# Altium footprint library Components.PcbLib: 260 footprints (part 14 of 17)
Each footprint in its own frame and in the unit in brackets; x right, y up, seen from the top. Pads: shape width x height; smd on the part's side, far side on the other; paste and mask are expansions set on the pad; w line width, h text height; cw(c..) or ccw(c..) is an arc to the next point about the centre after c.
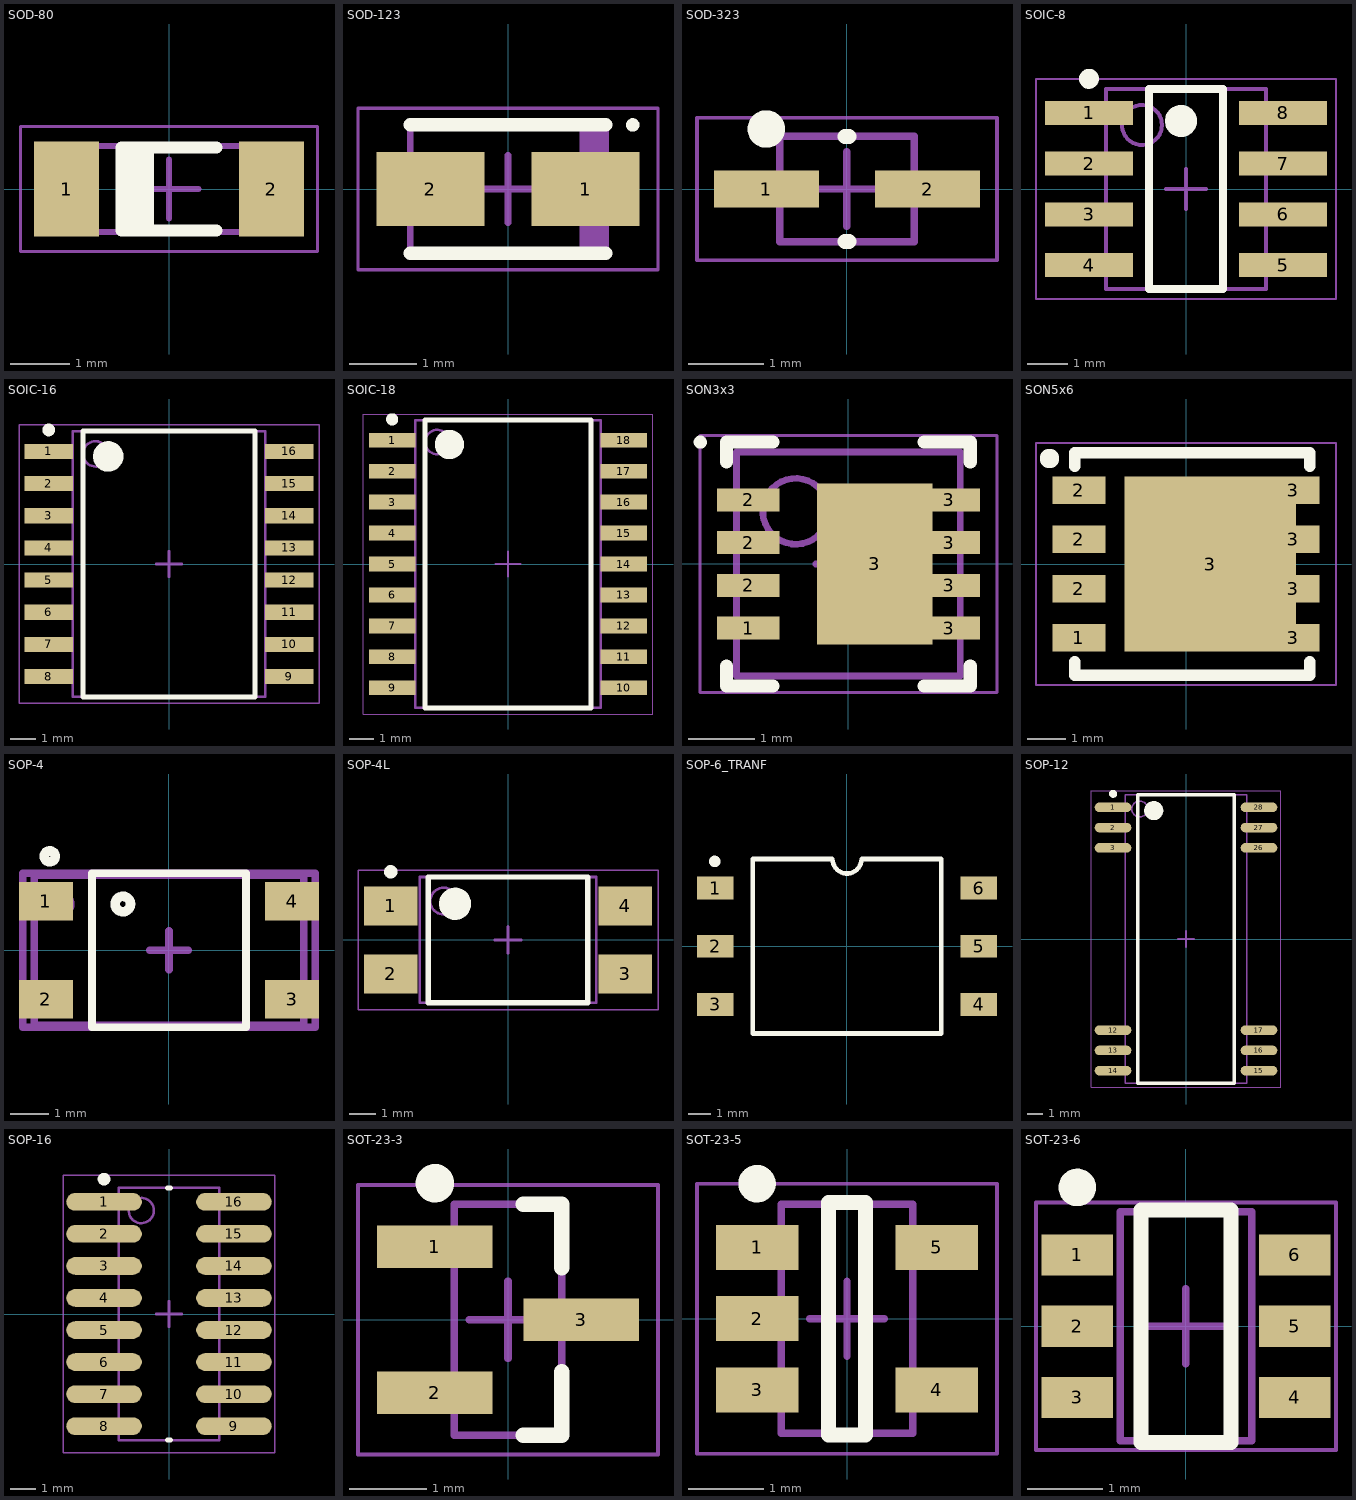
[diagram p13: the footprints below, top view; thin cyan lines are the x and y axes]

## SOD-80 [mm]
height 1.45
pads (2):
  rect 1.1x1.6 smd: 1(-1.725,0) 2(1.725,0)
Top Overlay:
  rectangle: -0.8,-0.7 -0.25,0.7
  lines w0.2: 0.8,-0.7 -0.8,-0.7 -0.8,0.7 0.8,0.7
Mechanical 13:
  lines w0.1: -1.85,-0.725 -1.85,0.725 1.85,0.725 1.85,-0.725 -1.85,-0.725
Mechanical 15:
  lines w0.05: -2.5,-1.05 -2.5,1.05 2.5,1.05 2.5,-1.05 -2.5,-1.05
  lines w0.1: -0.5,0 0.5,0 ; 0,-0.5 0,0.5
3D body: height 1.45, standoff 0, extent -1.85,-0.725 -1.5,0.725
3D body: height 1.44, standoff 0.04, extent -0.9,-0.696 -0.3,0.696
3D body: height 1.44, standoff 0.05, extent -1.5,-0.695 1.5,0.694
3D body: height 1.45, standoff 0, extent 1.5,-0.725 1.85,0.725

## SOD-123 [mm]
height 1.43
pads (2):
  rect 1.6x1.1 smd: 1(1.15,0) 2(-1.15,0)
Top Overlay:
  circle w0.1: c1.85,0.95 r0.05
  lines w0.2: -1.45,-0.95 1.45,-0.95 ; -1.45,0.95 1.45,0.95
Mechanical 13:
  rectangle: 1.06,-0.95 1.45,0.95
  lines w0.1: -1.45,-0.95 1.45,-0.95 1.45,0.95 -1.45,0.95 -1.45,-0.95
Mechanical 15:
  lines w0.05: -2.225,-1.2 2.225,-1.2 2.225,1.2 -2.225,1.2 -2.225,-1.2
  lines w0.1: -0.5,0 0.5,0 ; 0,-0.5 0,0.5
3D body "SMA_SUB.STEP": height 1.35, standoff 0, extent -1.85,-0.9 1.85,0.9

## SOD-323 [mm]
height 1.1
pads (2):
  rect 1.4x0.5 smd: 1(-1.075,0) 2(1.075,0)
Top Overlay:
  circle w0.25: c-1.075,0.8 r0.125
  lines w0.2: -0.025,-0.7 0.025,-0.7 ; -0.025,0.7 0.025,0.7
Mechanical 13:
  lines w0.1: -0.9,-0.7 0.9,-0.7 0.9,0.7 -0.9,0.7 -0.9,-0.7
Mechanical 15:
  lines w0.05: -2,-0.95 2,-0.95 2,0.95 -2,0.95 -2,-0.95
  lines w0.1: -0.5,0 0.5,0 ; 0,-0.5 0,0.5
3D body "SOD-323.step": height 1.1, standoff 0, extent -1.3,-0.675 1.3,0.675

## SOIC-8 [mm]
height 1.75
pads (8):
  rect 2.2x0.6 smd: 1(-2.425,1.905) 2(-2.425,0.635) 3(-2.425,-0.635) 4(-2.425,-1.905) 5(2.425,-1.905) 6(2.425,-0.635) 7(2.425,0.635) 8(2.425,1.905)
Top Overlay:
  circle w0.4: c-0.125,1.7 r0.2
  circle w0.25: c-2.425,2.755 r0.125
  lines w0.2: -0.925,-2.5 0.925,-2.5 0.925,2.5 -0.925,2.5 -0.925,-2.5
Mechanical 13:
  circle w0.1: c-1.1,1.6 r0.5
  lines w0.1: -2,-2.5 2,-2.5 2,2.5 -2,2.5 -2,-2.5
Mechanical 15:
  lines w0.05: -3.75,-2.75 3.75,-2.75 3.75,2.75 -3.75,2.75 -3.75,-2.75
  lines w0.1: -0.5,0 0.5,0 ; 0,-0.5 0,0.5
3D body "SOIC-8.step": height 1.75, standoff 0, extent -3,-2.45 3,2.45

## SOIC-16 [mm] "SOIC, 16-Leads, Body 10,30x7,50mm, Pitch 1,27mm, IPC Medium Density"
height 2.65
pads (16):
  rect 1.9x0.6 smd: 1(-4.75,4.445) 2(-4.75,3.175) 3(-4.75,1.905) 4(-4.75,0.635) 5(-4.75,-0.635) 6(-4.75,-1.905) 7(-4.75,-3.175) 8(-4.75,-4.445) 9(4.75,-4.445) 10(4.75,-3.175) 11(4.75,-1.905) 12(4.75,-0.635) 13(4.75,0.635) 14(4.75,1.905) 15(4.75,3.175) 16(4.75,4.445)
Top Overlay:
  circle w0.25: c-4.75,5.295 r0.125
  circle w0.6: c-2.4,4.25 r0.3
  lines w0.2: -3.4,-5.25 -3.4,5.25 3.4,5.25 3.4,-5.25 -3.4,-5.25
Mechanical 13:
  circle w0.1: c-2.9,4.35 r0.5
  lines w0.1: -3.8,-5.25 -3.8,5.25 3.8,5.25 3.8,-5.25 -3.8,-5.25
Mechanical 15:
  lines w0.05: -5.925,-5.5 -5.925,5.5 5.925,5.5 5.925,-5.5 -5.925,-5.5
  lines w0.1: -0.5,0 0.5,0 ; 0,-0.5 0,0.5
3D body "SOIC-16W.step": height 2.62, standoff -0.03, extent -5.315,-5.25 5.315,5.25

## SOIC-18 [mm]
height 2.65
pads (18):
  rect 1.9x0.6 smd: 1(-4.75,5.08) 2(-4.75,3.81) 3(-4.75,2.54) 4(-4.75,1.27) 5(-4.75,0) 6(-4.75,-1.27) 7(-4.75,-2.54) 8(-4.75,-3.81) 9(-4.75,-5.08) 10(4.75,-5.08) 11(4.75,-3.81) 12(4.75,-2.54) 13(4.75,-1.27) 14(4.75,0) 15(4.75,1.27) 16(4.75,2.54) 17(4.75,3.81) 18(4.75,5.08)
Top Overlay:
  circle w0.25: c-4.75,5.93 r0.125
  circle w0.6: c-2.4,4.9 r0.3
  lines w0.2: -3.4,-5.9 -3.4,5.9 3.4,5.9 3.4,-5.9 -3.4,-5.9
Mechanical 13:
  circle w0.1: c-2.9,5 r0.5
  lines w0.1: -3.8,-5.9 -3.8,5.9 3.8,5.9 3.8,-5.9 -3.8,-5.9
Mechanical 15:
  lines w0.05: -5.925,-6.15 -5.925,6.15 5.925,6.15 5.925,-6.15 -5.925,-6.15
  lines w0.1: -0.5,0 0.5,0 ; 0,-0.5 0,0.5
3D body "SOIC-18.step": height 1.7, standoff 0, extent -5.321,-5.6 5.321,5.576

## SON3x3 [mm] "SON, 8-Leads, Body 3,30x3,30mm, Pitch 0,65mm, Thermal Pad 1,73x1,69mm, IPC Medium Density"
height 1.1
pads (9):
  rect 0.95x0.35 smd: 1(-1.52,-0.975) 2(-1.52,-0.325) 2(-1.52,0.325) 2(-1.52,0.975) 3(1.52,-0.975) 3(1.52,-0.325) 3(1.52,0.325) 3(1.52,0.975)
  rect 1.75x2.45 smd: 3(0.4,0)
Top Overlay:
  circle w0.1: c-2.25,1.85 r0.05
  lines w0.2: -1.85,-1.55 -1.85,-1.85 -1.145,-1.85 ; -1.85,1.55 -1.85,1.85 -1.145,1.85 ; 1.145,-1.85 1.85,-1.85 1.85,-1.55 ; 1.145,1.85 1.85,1.85 1.85,1.55
Mechanical 13:
  circle w0.1: c-0.8,0.8 r0.5
  lines w0.1: -1.7,-1.7 -1.7,1.7 1.7,1.7 1.7,-1.7 -1.7,-1.7
Mechanical 15:
  lines w0.05: -2.255,-1.95 -2.255,1.95 2.255,1.95 2.255,-1.95 -2.255,-1.95
  lines w0.1: -0.5,0 0.5,0 ; 0,-0.5 0,0.5
3D body: height 1.1, standoff 0, extent -1.7,-1.7 1.7,1.7

## SON5x6 [mm] "SON, 8-Leads, Body 5,00x6,00mm, IPC Medium Density"
height 1
pads (9):
  rect 1.37x0.71 smd: 1(-2.77,-1.905) 2(-2.77,-0.635) 2(-2.77,0.635) 2(-2.77,1.905) 3(2.77,-1.905) 3(2.77,-0.635) 3(2.77,0.635) 3(2.77,1.905)
  rect 4.44x4.52 smd: 3(0.625,0)
Top Overlay:
  circle w0.4: c-3.525,2.725 r0.05
  lines w0.3: -2.875,-2.525 -2.875,-2.875 -0.25,-2.875 3.2,-2.875 3.2,-2.525 ; -2.875,2.525 -2.875,2.875 -0.25,2.875 3.2,2.875 3.2,2.525
Mechanical 15:
  lines w0.05: -3.875,-3.125 -3.1,-3.125 3.875,-3.125 3.875,3.125 -3.875,3.125 -3.875,2.25 -3.875,-3.125
3D body: height 0.2, standoff 0, extent 2.85,1.575 3.025,2.25
3D body: height 0.2, standoff 0, extent 2.85,0.3 3.025,0.975
3D body: height 0.2, standoff 0, extent 2.85,-0.975 3.025,-0.3
3D body: height 0.2, standoff 0, extent 2.85,-2.25 3.025,-1.575
3D body: height 0.2, standoff 0, extent -3.025,-2.25 -2.85,-1.575
3D body: height 0.2, standoff 0, extent -3.025,-0.975 -2.85,-0.3
3D body: height 0.2, standoff 0, extent -3.025,0.3 -2.85,0.975
3D body: height 0.2, standoff 0, extent -3.025,1.575 -2.85,2.25
3D body: height 1, standoff 0, extent -3,-2.5 3,2.5

## SOP-4 [mm] "G3VM-61G1 SSR optocoupler footprint"
height 2.1
pads (4):
  rect 1.4x1 smd: 1(-3.2,1.27) 2(-3.2,-1.27) 3(3.2,-1.27) 4(3.2,1.27)
Top Overlay:
  circle w0.25: c-1.2,1.2 r0.2
  circle w0.25: c-3.1,2.441 r0.141
  lines w0.2: -2,-2 -2,2 2,2 2,-2 -2,-2
Mechanical 13:
  circle w0.25: c-2.8,1.2 r0.224
  lines w0.2: -3.5,-1.95 -3.5,1.95 3.5,1.95 3.5,-1.95 -3.5,-1.95
Mechanical 15:
  lines w0.2: -0.5,0 0.5,0 ; 0,-0.5 0,0.5 ; -3.8,-2 -3.8,2 3.8,2 3.8,-2 -3.8,-2
3D body "g3vm-61g1.stp": height 2.11, standoff 0.01, extent -3.5,-1.95 3.5,1.95

## SOP-4L [mm] "SOP, 4-Leads, Body 4,58x6,50mm, Pitch 2,54mm, IPC Medium Density"
height 3.7
pads (4):
  rect 2x1.45 smd: 1(-4.375,1.27) 2(-4.375,-1.27) 3(4.375,-1.27) 4(4.375,1.27)
Top Overlay:
  circle w0.25: c-4.375,2.545 r0.125
  circle w0.6: c-1.975,1.35 r0.3
  lines w0.2: -2.975,-2.35 -2.975,2.35 2.975,2.35 2.975,-2.35 -2.975,-2.35
Mechanical 13:
  circle w0.1: c-2.4,1.45 r0.5
  lines w0.1: -3.3,-2.35 -3.3,2.35 3.3,2.35 3.3,-2.35 -3.3,-2.35
Mechanical 15:
  lines w0.05: -5.6,-2.6 -5.6,2.6 5.6,2.6 5.6,-2.6 -5.6,-2.6
  lines w0.1: -0.5,0 0.5,0 ; 0,-0.5 0,0.5
3D body "KB817-B.STEP": height 3.8, standoff -0.02, extent -4.94,-2.29 4.94,2.29

## SOP-6_TRANF [mm]
pads (6):
  rect 1.6x1 smd: 1(-5.75,2.54) 2(-5.75,0) 3(-5.75,-2.54) 4(5.75,-2.54) 5(5.75,0) 6(5.75,2.54)
Top Overlay:
  circle w0.25: c-5.775,3.705 r0.125
  lines w0.2: -4.115,-3.81 4.115,-3.81 4.115,3.81 0.635,3.81 cw(c0,3.81) -0.635,3.81 -4.115,3.81 -4.115,-3.81
3D body "User Library-78253MC_SMD.STEP": height 6.35, standoff 0, extent -6.385,-4.445 6.315,4.445

## SOP-12 [mm]
pads (12):
  oval 2.3x0.6 smd: 1(-4.575,8.255) 2(-4.575,6.985) 3(-4.575,5.715) 12(-4.575,-5.715) 13(-4.575,-6.985) 14(-4.575,-8.255) 15(4.575,-8.255) 16(4.575,-6.985) 17(4.575,-5.715) 26(4.575,5.715) 27(4.575,6.985) 28(4.575,8.255)
Top Overlay:
  circle w0.6: c-2.025,8.05 r0.3
  circle w0.25: c-4.575,9.105 r0.125
  lines w0.2: -3.025,-9.05 3.025,-9.05 3.025,9.05 -3.025,9.05 -3.025,-9.05
Mechanical 13:
  circle w0.1: c-2.9,8.15 r0.5
  lines w0.1: -3.8,-9.05 3.8,-9.05 3.8,9.05 -3.8,9.05 -3.8,-9.05
Mechanical 15:
  lines w0.05: -5.95,-9.3 5.95,-9.3 5.95,9.3 -5.95,9.3 -5.95,-9.3
  lines w0.1: -0.5,0 0.5,0 ; 0,-0.5 0,0.5
3D body "SOIC-28.STEP": height 2.75, standoff 0, extent -5.2,-8.95 5.1,8.95

## SOP-16 [mm] "PCA9546A"
height 1.75
pads (16):
  oval 3x0.7 smd: 1(-2.575,4.445) 2(-2.575,3.175) 3(-2.575,1.905) 4(-2.575,0.635) 5(-2.575,-0.635) 6(-2.575,-1.905) 7(-2.575,-3.175) 8(-2.575,-4.445) 9(2.575,-4.445) 10(2.575,-3.175) 11(2.575,-1.905) 12(2.575,-0.635) 13(2.575,0.635) 14(2.575,1.905) 15(2.575,3.175) 16(2.575,4.445)
Top Overlay:
  circle w0.25: c-2.575,5.345 r0.125
  lines w0.2: -0.05,-5 0.05,-5 ; -0.05,5 0.05,5
Mechanical 13:
  circle w0.1: c-1.1,4.1 r0.5
  lines w0.1: -2,-5 2,-5 2,5 -2,5 -2,-5
Mechanical 15:
  lines w0.05: -4.2,-5.5 4.2,-5.5 4.2,5.5 -4.2,5.5 -4.2,-5.5
  lines w0.1: -0.5,0 0.5,0 ; 0,-0.5 0,0.5
3D body "SOIC-16.step": height 1.75, standoff 0, extent -3,-5 3,5

## SOT-23-3 [mm] "SOT23, 3-Leads, Body 2,90x2,45mm, Pitch 0,95mm, IPC Medium Density"
height 1.1
pads (3):
  rect 1.5x0.55 smd: 1(-0.95,0.95) 2(-0.95,-0.95) 3(0.95,0)
Top Overlay:
  circle w0.25: c-0.95,1.775 r0.125
  lines w0.2: 0.2,-1.5 0.7,-1.5 0.7,-0.675 ; 0.2,1.5 0.7,1.5 0.7,0.675
Mechanical 13:
  lines w0.1: -0.7,-1.5 0.7,-1.5 0.7,1.5 -0.7,1.5 -0.7,-1.5
Mechanical 15:
  lines w0.05: -1.95,-1.75 1.95,-1.75 1.95,1.75 -1.95,1.75 -1.95,-1.75
  lines w0.1: -0.5,0 0.5,0 ; 0,-0.5 0,0.5
3D body "SOT-23-3.step": height 1.3, standoff 0, extent -1.4,-1.45 1.4,1.45

## SOT-23-5 [mm] "SOT23, 5-Leads, Body 2,90x2,80mm, Pitch 0,95mm, IPC Medium Density"
height 1.45
pads (5):
  rect 1.1x0.6 smd: 1(-1.2,0.95) 2(-1.2,0) 3(-1.2,-0.95) 4(1.2,-0.95) 5(1.2,0.95)
Top Overlay:
  circle w0.25: c-1.2,1.8 r0.125
  lines w0.2: -0.25,-1.55 -0.25,1.55 0.25,1.55 0.25,-1.55 -0.25,-1.55
Mechanical 13:
  lines w0.1: -0.875,-1.525 0.875,-1.525 0.875,1.525 -0.875,1.525 -0.875,-1.525
Mechanical 15:
  lines w0.05: -2,-1.8 2,-1.8 2,1.8 -2,1.8 -2,-1.8
  lines w0.1: -0.5,0 0.5,0 ; 0,-0.5 0,0.5
3D body "SOT-23-5.step": height 1.45, standoff 0, extent -1.4,-1.45 1.4,1.45

## SOT-23-6 [mm] "SOT23, 6-Leads, Body 2,90x3,60mm, Pitch 0,95mm, IPC High Density"
pads (6):
  rect 0.95x0.55 smd: 1(-1.45,0.95) 2(-1.45,0) 3(-1.45,-0.95) 4(1.45,-0.95) 5(1.45,0) 6(1.45,0.95)
Top Overlay:
  circle w0.25: c-1.45,1.85 r0.125
  lines w0.2: -0.6,-1.55 0.6,-1.55 0.6,1.55 -0.6,1.55 -0.6,-1.55
Mechanical 13:
  lines w0.1: -0.875,-1.525 -0.875,1.525 0.875,1.525 0.875,-1.525 -0.875,-1.525
Mechanical 15:
  lines w0.05: -2,-1.65 -2,1.65 2,1.65 2,-1.65 -2,-1.65
  lines w0.1: -0.5,0 0.5,0 ; 0,-0.5 0,0.5
3D body "SOT-23-6.step": height 1.45, standoff 0, extent -1.4,-1.45 1.4,1.45